# Altium footprint library BARKO_PCBLIB.PcbLib: 531 footprints (part 5 of 34)
Each footprint in its own frame and in the unit in brackets; x right, y up, seen from the top. Pads: shape width x height; smd on the part's side, far side on the other; paste and mask are expansions set on the pad; w line width, h text height; cw(c..) or ccw(c..) is an arc to the next point about the centre after c.
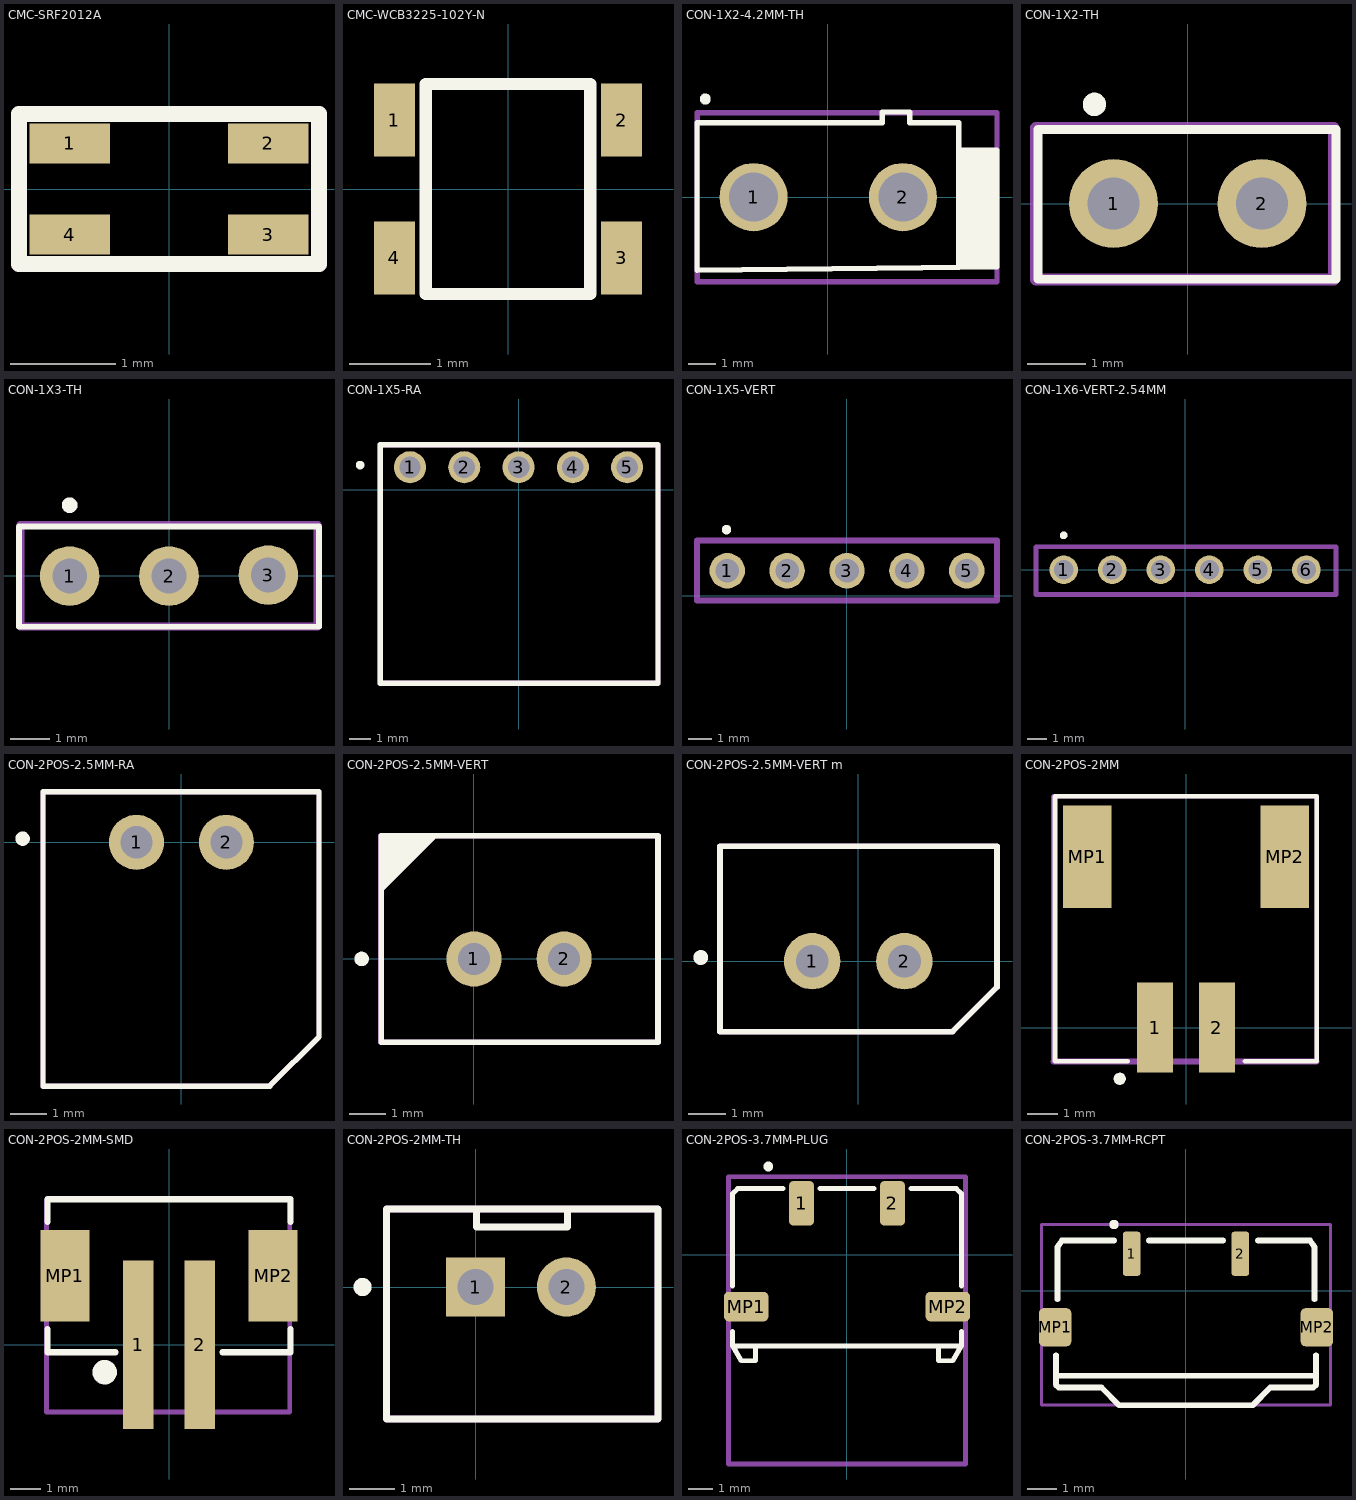
[diagram p4: the footprints below, top view; thin cyan lines are the x and y axes]

## CMC-SRF2012A [mil]
pads (4):
  rect 30x15 smd mask+1.97: 1(-37,17) 2(37,17) 3(37,-17) 4(-37,-17)
Top Overlay:
  lines w6: -56,-28 -56,28 56,28 56,-28 -56,-28
ASM Top:
  lines w6: -56,-28 56,-28 56,28 -56,28 -56,-28
  text ".designator" at -37,-17 h31.5
3D body "User Library-SRF2012A.STEP": height 47.73, standoff 0.76, extent -40.74,-23.62 38,23.62

## CMC-WCB3225-102Y-N [mm]
pads (4):
  rect 0.5x0.9 smd mask+0.051: 1(-1.4,0.85) 2(1.4,0.85) 3(1.4,-0.85) 4(-1.4,-0.85)
Top Overlay:
  lines w0.152: -1.016,-1.295 1.016,-1.295 1.016,1.295 -1.016,1.295 -1.016,-1.295
ASM Top:
  lines w0.1: -1.016,-1.295 1.016,-1.295 1.016,1.295 -1.016,1.295 -1.016,-1.295
  text ".designator" at -0.152,0 h0.8
3D body "1206USB.STEP": height 1.94, standoff 0.01, extent -1.66,-0.784 1.66,0.936

## CON-1X2-4.2MM-TH [mm]
pads (2):
  round 2.5 hole 1.8: 1(-2.725,0) 2(2.75,0)
Top Overlay:
  circle w0.2: c-4.499,3.6 r0.1
  rectangle: 4.8,-2.55 6.2,1.725
  lines w0.2: 4.8,-2.575 4.8,1.725 ; 4.8,1.725 6.2,1.725 6.2,-2.55 3.45,-2.588 -4.802,-2.672 -4.802,2.725 1.99,2.725 1.99,3.124 3,3.124 3,2.725 4.8,2.725 4.8,1.725
ASM Top:
  lines w0.2: -4.8,-3.1 6.2,-3.1 6.2,3.1 -4.8,3.1 -4.8,-3.1
  text ".designator" at -1.493,-0.212 h0.8
3D body "039281023.stp": height 12.61, standoff -3.69, extent -4.8,-3.1 6.2,3.1

## CON-1X2-TH [mil]
pads (2):
  round 60 hole 35: 1(-50,0) 2(50,0)
Top Overlay:
  circle w7.87: c-62.96,66.93 r3.94
  lines w6: -101,-51 -101,50 100,50 100,-51 -101,-51
ASM Top:
  lines w7.87: -102.36,-51.18 -102.36,51.18 98.43,51.18 98.43,-51.18 -102.36,-51.18
  text ".designator" at -15.75,-7.87 h31.5
3D body "1x2 TH Pitch 2_54mm.STEP": height 373.85, standoff -125.98, extent -100,-51 100,49

## CON-1X3-TH [mil]
pads (3):
  round 60 hole 35: 1(-100,-0.5) 2(0,-0.5) 3(100,0.5)
Top Overlay:
  circle w7.87: c-99.98,70.87 r3.94
  lines w6: -151,-51.5 151,-51.5 151,49.5 -151,49.5 -151,-51.5
ASM Top:
  lines w7.87: -149.61,-51.18 149.61,-51.18 149.61,51.18 -149.61,51.18 -149.61,-51.18
  text ".designator" at -39.37,-3.94 h31.5
3D body "61300311121_Download_STP_61300311121_rev1.stp": height 336.72, standoff -117.61, extent -150.01,-50 149.99,50

## CON-1X5-RA [mm]
pads (5):
  round 1.5 hole 1: 1(-5.07,1.06) 2(-2.535,1.06) 3(0,1.06) 4(2.535,1.06) 5(5.07,1.06)
Top Overlay:
  circle w0.2: c0.001,1.16 r0.1
  circle w0.2: c-7.399,1.16 r0.1
  lines w0.254: -6.47,-9.03 -6.47,2.11 6.51,2.11 6.51,-9.03 -6.47,-9.03
ASM Top:
  lines w0.254: -6.47,-9.03 6.51,-9.03 6.51,2.11 -6.47,2.11 -6.47,-9.03
  text ".designator" at -0.457,-2.337 h0.8
3D body "61300511021 (rev1).stp": height 2.55, standoff -2.99, extent -6.32,-8.9 6.38,1.46

## CON-1X5-VERT [mm]
pads (5):
  round 1.5 hole 1: 1(-5.07,1.06) 2(-2.535,1.06) 3(0,1.06) 4(2.535,1.06) 5(5.07,1.06)
Top Overlay:
  circle w0.2: c-5.1,2.8 r0.1
ASM Top:
  lines w0.254: -6.35,-0.21 -6.35,2.33 6.35,2.33 6.35,-0.21 -6.35,-0.21
  text ".designator" at 0,1.06 h0.8
3D body "Download_STP_61300511121 (rev1).stp": height 8.05, standoff -3.49, extent -6.35,-0.21 6.35,2.33

## CON-1X6-VERT-2.54MM [mm]
pads (6):
  round 1.5 hole 1: 1(-6.35,0) 2(-3.81,0) 3(-1.27,0) 4(1.27,0) 5(3.81,0) 6(6.35,0)
Top Overlay:
  circle w0.2: c-6.35,1.8 r0.1
MDA Layer:
  lines w0.2: -7.8,-1.3 7.9,-1.3 7.9,1.2 -7.8,1.2 -7.8,-1.3
ASM Top:
  lines w0.254: -7.8,-1.3 7.9,-1.3 7.9,1.2 -7.8,1.2 -7.8,-1.3
  text ".designator" at -1.28,0 h0.8
3D body "m20-7820646_asm.stp": height 8.51, standoff -2.99, extent -7.775,-1.27 7.865,1.23

## CON-2POS-2.5MM-RA [mil]
pads (2):
  round 60 hole 35: 1(-49,0) 2(49,0)
Top Overlay:
  circle w7.87: c-173.23,3.94 r3.94
  lines w5.91: -151,-266 -151,55 150,55 150,-212.2 96.2,-266 -151,-266
ASM Top:
  lines w5.91: -151,-266 -151,55 150,55 150,-212.2 96.2,-266 -151,-266
  text ".designator" at 111,-94 h31.5
3D body "022057025.stp": height 196.46, standoff -134.25, extent -146,-261.02 145.34,50

## CON-2POS-2.5MM-VERT [mil]
pads (2):
  round 60 hole 35: 1(0,0) 2(98,0)
Top Overlay:
  circle w7.87: c-122.05,0 r3.94
  region: -99.61,133.86 -99.61,72.86 -38.61,133.86
  lines w6: -100.61,-90.55 200,-90.55 200,133.86 -100.61,133.86 -100.61,-90.55
ASM Top:
  lines w6: -101,-90.55 -101,133.86 200,133.86 200,-90.55 -101,-90.55
  text ".designator" at -37.61,-7.87 h31.5

## CON-2POS-2.5MM-VERT m [mil]
pads (2):
  round 60 hole 35: 1(-49,0) 2(49,0)
Top Overlay:
  circle w7.87: c-167.54,3.94 r3.94
  lines w6: -147.06,-74.8 100.18,-74.8 147.43,-27.56 147.43,122.05 -147.06,122.05 -147.06,-74.8
ASM Top:
  lines w6: -147.06,-74.8 100.18,-74.8 147.43,-27.56 147.43,122.05 -147.06,122.05 -147.06,-74.8
  text ".designator" at -49,30 h31.5
3D body "022035025.stp": height 232.79, standoff -137.29, extent -143.92,-72.05 147.42,120.86

## CON-2POS-2MM [mm]
pads (4):
  rect 1.2x3 smd: 1(-1.029,0) 2(1.029,0)
  rect 1.6x3.4 smd: MP1(-3.28,5.67) MP2(3.28,5.67)
Top Overlay:
  circle w0.2: c-2.2,-1.7 r0.1
  lines w0.152: -1.931,-1.125 -4.35,-1.125 -4.35,7.68 4.34,7.68 4.34,-1.125 1.959,-1.125
ASM Top:
  lines w0.152: -4.4,-1.125 -4.4,7.68 4.34,7.68 4.34,-1.125
  lines w0.2: -4.4,-1.125 4.34,-1.125
  text ".designator" at -1.2,4.1 h0.8
3D body "S2B-PH-SM4-TB(LF)(SN)--3DModel-STEP-56544.STEP": height 5.63, standoff -0.34, extent -4,-1.37 3.9,7.466

## CON-2POS-2MM-SMD [mm]
pads (4):
  rect 1x5.5 smd: 1(-1,0) 2(1,0)
  rect 1.6x3 smd: MP1(-3.4,2.25) MP2(3.4,2.25)
Top Overlay:
  circle w0.4: c-2.1,-0.9 r0.2
  lines w0.2: -3.975,0.5 -3.975,-0.25 -1.75,-0.25 ; -3.975,4 -3.975,4.75 3.975,4.75 3.975,4 ; 1.75,-0.25 3.975,-0.25 3.975,0.5
ASM Top:
  lines w0.152: -4,-2.2 -4,4.725 -3.975,4.75 3.975,4.75 3.95,4.725 3.95,-2.2 3.85,-2.2 -4,-2.2
  text ".designator" at -1.5,1.5 h0.8
3D body "B2B-PH-SM4-TB.STEP": height 6.61, standoff 0.01, extent -4,-2.2 3.95,4.8

## CON-2POS-2MM-TH [mm]
pads (2):
  rect 1.308x1.308 hole 0.8: 1(0,0)
  round 1.308 hole 0.8: 2(2.006,0)
Top Overlay:
  circle w0.2: c-2.5,0 r0.1
  lines w0.152: 0.02,1.69 0.02,1.323 2.026,1.323 2.026,1.678 ; -1.969,-2.921 -1.969,1.729 4.031,1.729 4.031,-2.921 -1.969,-2.921
ASM Top:
  lines w0.152: -1.969,-2.921 -1.969,1.729 4.031,1.729 4.031,-2.921 -1.969,-2.921
  text ".designator" at 0.506,-0.6 h0.8
3D body "894000220.stp": height 6.07, standoff -3.38, extent -2.022,-2.96 3.978,1.69

## CON-2POS-3.7MM-PLUG [mm]
height 3
pads (4):
  rrect30% 1x1.8 smd: 1(-1.85,2.1) 2(1.85,2.1)
  rrect30% 1.8x1.2 smd: MP1(-4.1,-2.1) MP2(4.1,-2.1)
Top Overlay:
  circle w0.2: c-3.2,3.6 r0.1
  lines w0.2: -4.65,-3.1 -4.65,-3.7 ; -4.65,-1.27 -4.65,2.5 -4.45,2.7 -2.6,2.7 ; -3.725,-3.7 -3.725,-4.3 -4.3,-4.3 -4.65,-3.7 ; -1.1,2.7 1.1,2.7 ; 2.6,2.7 4.45,2.7 4.65,2.5 4.65,-1.27 ; 3.725,-3.7 3.725,-4.3 4.3,-4.3 4.65,-3.7 4.65,-3.1 ; 4.6,-3.7 0,-3.7 -4.65,-3.7
ASM Top:
  lines w0.2: -4.82,-8.5 -4.82,3.18 4.82,3.18 4.82,-8.5 4.6,-8.5 -4.82,-8.5
  text ".designator" at -1.5,-0.9 h0.8
3D body "5034690200.stp": height 3.01, standoff 0.01, extent -4.649,-8.5 4.651,2.7

## CON-2POS-3.7MM-RCPT [mm]
height 3
pads (4):
  rrect30% 0.6x1.5 smd: 1(-1.85,1.25) 2(1.85,1.25)
  rrect30% 1.1x1.3 smd: MP1(-4.45,-1.25) MP2(4.45,-1.25)
Top Overlay:
  circle w0.2: c-2.447,2.244 r0.058
  lines w0.2: -4.425,-2.9 4.425,-2.9 ; -4.425,-2.2 -4.425,-3.2 -4.325,-3.3 -2.875,-3.3 -2.275,-3.9 2.275,-3.9 2.866,-3.3 4.325,-3.3 4.425,-3.2 4.425,-2.2 ; -4.375,-0.297 -4.375,1.479 -4.225,1.7 -2.447,1.7 ; -1.258,1.7 1.253,1.7 ; 2.448,1.7 4.225,1.7 4.375,1.479 4.375,-0.297
ASM Top:
  circle w0.2: c-2.447,2.244 r0.058
  lines w0.1: -4.919,-3.9 4.919,-3.9 4.919,2.244 -4.919,2.244 -4.919,1.7 -4.919,-3.9
  text ".designator" at -1.258,-1.369 h0.8
3D body "5034710200.stp": height 3.01, standoff 0.01, extent -4.875,-3.9 4.875,1.7